# Altium integrated library EFR_Lib.IntLib: 430 symbols (part 5 of 6)
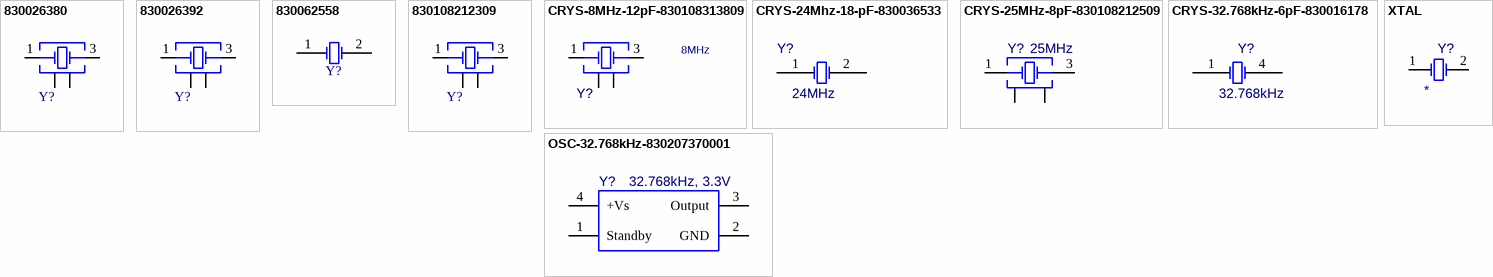
[diagram p33: symbols 830026380 to XTAL]

## 830062558
designator Y?, comment 32.768kHz  (value not drawn)
WE-XTAL Watch Crystal, SMT, IQXC-25, 32.768kHz, +/-10ppm; Manufacturer P/N: 830062558; Manufacturer: Wurth Elektronik; Load Capacitance: 9pF; ComponentLink1Description: Website Link; ComponentLink1URL: https://www.we-online.com/redexpert/article/830062558?ad; ComponentLink2Description: Datasheet Link; ComponentLink2URL: https://www.we-online.com/redexpert/spec/830062558?ad; Category: Crystals; Match Code: WE-XTAL; Mount: Surface Mount; Operating Temperature Max: 85°C; Operating Temperature Min: -40°C; Packaging: Tape and Reel; Case/Size Code: IQXC-25; Length: 2mm; Width: 1.2mm; Height: 0.6mm; Frequency: 32.768kHz; Frequency Tolerance: +/-10ppm
footprint WE-XTAL_IQXC-25
pins: 1 OSC1, 2 OSC2

## 830108212309
designator Y?, comment 24MHz  (value not drawn)
WE-XTAL Quartz Crystal, SMT, IQXC-42, 24MHz, +/-10ppm; Manufacturer P/N: 830108212309; Manufacturer: Wurth Elektronik; Frequency Stability: +/-15ppm; Load Capacitance: 8pF; ComponentLink1Description: Website Link; ComponentLink1URL: https://www.we-online.com/redexpert/article/830108212309?ad; ComponentLink2Description: Datasheet Link; ComponentLink2URL: https://www.we-online.com/redexpert/spec/830108212309?ad; Category: Crystals; Match Code: WE-XTAL; Mount: Surface Mount; Operating Temperature Max: 85°C; Operating Temperature Min: -40°C; Packaging: Tape and Reel; Case/Size Code: IQXC-42; Length: 2mm; Width: 1.6mm; Height: 0.5mm; Frequency: 24MHz; Frequency Tolerance: +/-10ppm
footprint WE-XTAL_IQXC-42 new (Quartz Crystal, size IQXC-42, body 2x1.6mm)
pins: 1 Crystal, 2 GND, 3 Crystal, 4 GND

## CRYS-8MHz-12pF-830108313809
designator Y?, comment 8MHz
WE-XTAL Quartz Crystal, SMT, CFPX-180, 8MHz, +/-30ppm; Manufacturer P/N: 830108313809; Manufacturer: Wurth Elektronik; Frequency Stability: +/-50ppm; Load Capacitance: 12pF; ComponentLink1Description: Website Link; ComponentLink1URL: https://www.we-online.com/redexpert/article/830108313809?ad; ComponentLink2Description: Datasheet Link; ComponentLink2URL: https://www.we-online.com/redexpert/spec/830108313809?ad; Category: Crystals; Match Code: WE-XTAL; Mounting Technology: SMT; Operating Temperature Max: 85°C; Operating Temperature Min: -40°C; Packaging: Tape and Reel; Case/Size Code: CFPX-180; Length: 3.4mm; Width: 2.7mm; Height: 0.8mm; Frequency: 8MHz; Frequency Tolerance: +/-30ppm
footprint WE-XTAL_CFPX-180
pins: 1 Crystal, 2 GND&Lid, 3 Crystal, 4 GND&Lid

## CRYS-24Mhz-18-pF-830036533
designator Y?, comment 24MHz
WE-XTAL Quartz Crystal, SMT, HC49/4HSMX, 24MHz, +/-30ppm; PartNumber: 830036533; Manufacturer: Wurth Elektronik; Frequency Stability: +/-50ppm; Load Capacitance: 18pF; ComponentLink1Description: Manufacturer; ComponentLink1URL: https://www.we-online.com/katalog/en/WE-XTAL#830036533; ComponentLink2Description: Datasheet; ComponentLink2URL: https://katalog.we-online.com/pbs/datasheet/830036533.pdf; Operating Temperature: -40 to +85degC; Packaging: Tape and Reel; Published Date: July 2020; Size: HC49/4HSMX; Frequency: 24MHz; Frequency Tolerance: +/-30ppm; Mounting Technology: SMT; Supplier 1: Mouser; Supplier 2: DigiKey; Supplier 3: Mouser; Supplier 4: DigiKey; Supplier Part Number 1: 710-830036533; Supplier Part Number 2: 1923-830036533CT-ND; Supplier Part Number 3: 710-830036533; Supplier Part Number 4: 1923-830036533CT-ND
footprint WE-XTAL_HC49/4HSMX
pins: 1 OSC1, 2 OSC2

## CRYS-25MHz-8pF-830108212509
designator Y?, comment 25MHz
WE-XTAL Quartz Crystal, SMT, IQXC-42, 25MHz, +/-10ppm; PartNumber: 830108212509; Manufacturer: Wurth Elektronik; Frequency Stability: +/-15ppm; Load Capacitance: 8pF; ComponentLink1Description: Manufacturer; ComponentLink1URL: https://www.we-online.com/catalog/en/WE-XTAL?sq=830108212509#/articles/IQXC-42; ComponentLink2Description: Datasheet; ComponentLink2URL: https://katalog.we-online.com/pbs/datasheet/830108212509.pdf; Operating Temperature: -40 to +85degC; Packaging: Tape and Reel; Published Date: July 2020; Size: IQXC-42; Frequency: 25MHz; Frequency Tolerance: +/-10ppm; Mounting Technology: SMT
footprint WE-XTAL_IQXC-42
pins: 1 Crystal, 2 GND, 3 Crystal, 4 GND

## CRYS-32.768kHz-6pF-830016178
designator Y?, comment 32.768kHz
WE-XTAL Watch Crystal, SMT, 85SMX, 32.768kHz, +/-20ppm; PartNumber: 830016178; Manufacturer: Wurth Elektronik; Load Capacitance: 6pF; ComponentLink1Description: Manufacturer; ComponentLink1URL: https://www.we-online.com/katalog/en/WE-XTAL_WATCHCRYSTAL#830016178; ComponentLink2Description: Datasheet; ComponentLink2URL: https://katalog.we-online.com/pbs/datasheet/830016178.pdf; Operating Temperature: -40 to +85degC; Packaging: Tape and Reel; Published Date: July 2020; Size: 85SMX; Frequency Stability: -; Frequency: 32.768kHz; Frequency Tolerance: +/-20ppm; Mounting Technology: SMT
footprint WE-XTAL_85SMX
pins: 1 Crystal, 4 Crystal

## OSC-32.768kHz-830207370001
designator Y?, comment 32.768kHz, 3.3V
WE-SPXO Simple Packaged Quartz Oscillator, SMT, IQXO-402, 32.768kHz, 3.3V; Manufacturer: Wurth Elektronik; PartNumber: 830207370001; Frequency Stability: +/-30ppm; ComponentLink1URL: https://www.we-online.com/catalog/en/WE-SPXO?sq=830207370001#/articles/WE-SPXO_IQXO-402; ComponentLink2URL: https://www.we-online.com/catalog/datasheet/830207370001.pdf; Supply Voltage: 3.3V; Size: IQXO-402; Packaging: Tape and Reel; Operating Temperature: -40 to +85degC; Mounting Technology: SMT; Published Date: November 2020; ComponentLink1Description: Manufacturer; Frequency: 32.768kHz; ComponentLink2Description: Datasheet
footprint WE-SPXO_IQXO-402
pins: 1 Standby, 2 GND, 3 Output, 4 +Vs

## XTAL
designator Y?
Crystal Oscillator; PartNumber: *; LoadCap: *; Manufacturer: *; Frequence: *
simulation model XTAL (Spice Subcircuit)
footprint XT49S (Vishay Crystal)
footprint WE-XTAL_HC49/4HSMX (Quartz Crystal, size HC49/4HSMX, body 11.4x4.9mm)
pins: 1 OSC1, 2 OSC2


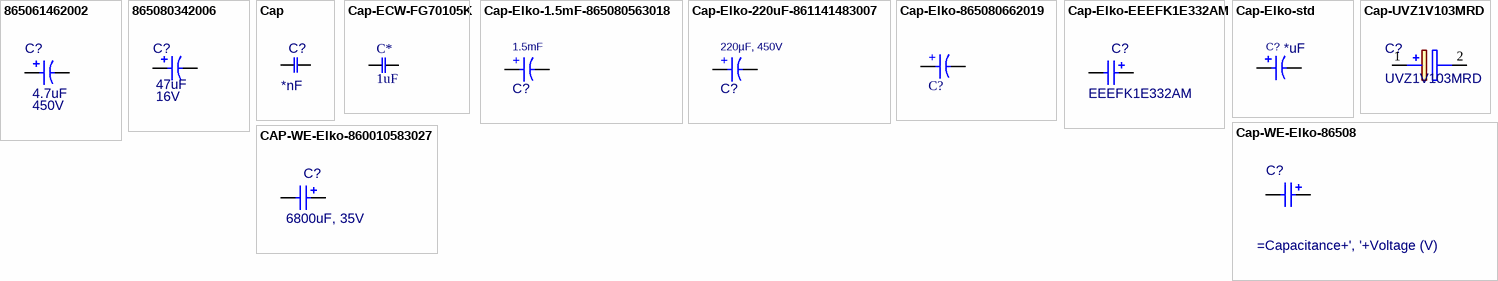
[diagram p20: symbols 865061462002 to CAP-WE-Elko-860010583027]

## 865061462002
designator C?, comment 4.7uF  Rated Voltage (DC): 450V
WCAP-ASLL Aluminum Electrolytic Capacitor, V-Chip, SMT, D12.5 x H14mm, 4.7uF, 450V; Manufacturer Part Number: 865061462002; Manufacturer: Wurth Elektronik; Capacitance Tolerance: +/-20%; Dissipation Factor: 20%; Endurance: 5000h; Leakage Current: 121.15uA; Ripple Current: 50mA; Technical Reference: ASDH1404R7M450DVCTGE000; Category: Aluminum Electrolytic Capacitors; Match Code: WCAP-ASLL; ComponentLink1Description: Website Link; ComponentLink1URL: https://www.we-online.com/redexpert/article/865061462002?ad; ComponentLink2Description: Datasheet Link; ComponentLink2URL: https://www.we-online.com/redexpert/spec/865061462002?ad; Mount: Surface Mount; Operating Temperature Max: 105°C; Operating Temperature Min: -40°C; Packaging: Tape and Reel; Height: 14mm; Diameter: 12.5mm; Capacitance: 4.7uF
simulation model 865061462002_4.7uF
footprint WCAP-ASLL_D12.5H14 (Aluminium Electrolytic V-Chip SMT Capacitors, 12.5x14mm)
pins: 1 P, 2 N
text: +

## 865080342006
designator C?, comment 47uF  Rated Voltage (DC): 16V
WCAP-ASLI Aluminum Electrolytic Capacitor, V-Chip, D5 x H5.5mm, 47uF, 16V; Manufacturer Part Number: 865080342006; Manufacturer: Wurth Elektronik; Capacitance Tolerance: +/-20%; Dissipation Factor: 16%; Endurance: 2000h; Leakage Current: 7.52uA; Ripple Current: 195mA; Technical Reference: ASEC055470M016DVCTBB000; Category: Aluminum Electrolytic Capacitors; Match Code: WCAP-ASLI; ComponentLink1Description: Website Link; ComponentLink1URL: https://www.we-online.com/redexpert/article/865080342006?ad; ComponentLink2Description: Datasheet Link; ComponentLink2URL: https://www.we-online.com/redexpert/spec/865080342006?ad; Mount: Surface Mount; Operating Temperature Max: 105°C; Operating Temperature Min: -55°C; Packaging: Tape and Reel; Height: 5.5mm; Diameter: 5mm; Capacitance: 47uF
simulation model 865080342006_47uF
footprint WCAP-ASLI_D5H5.5 (Aluminium Electrolytic V-Chip SMT Capacitors, 5x5.5mm)
pins: 1 P, 2 N
text: +

## Cap
designator C?, comment Capacitance: *nF  (hidden comment: Capacitor)
General Capacitor; Type: Ceramic; PinNumber: 2; Value: *nF; Manufacturer: *; PartNumber: *; Voltage (V): *; Current (A): *; Tolerance: *; Power (W): *; Resistance: *
footprint 0603(1608)_L (Chip Resistor, 2-Leads, Body 1.60x0.85mm, IPC High Density)
footprint 0603(1608)_N (Chip Resistor, 2-Leads, Body 1.60x0.85mm, IPC Medium Density)
footprint 0603(1608)_M (Chip Resistor, 2-Leads, Body 1.60x0.85mm, IPC Low Density)
footprint 0805(2012)_L (Chip Resistor, 2-Leads, Body 2.00x1.25mm, IPC High Density)
footprint 0805(2012)_N (Chip Resistor, 2-Leads, Body 2.00x1.25mm, IPC Medium Density)
footprint 0805(2012)_M (Chip Resistor, 2-Leads, Body 2.00x1.25mm, IPC Low Density)
footprint 1206(3216)_L (Chip Resistor, Body 3.2x1.6mm, IPC High Density)
footprint 1206(3216)_N (Chip Resistor, Body 3.2x1.6mm, IPC Medium Density)
footprint 1206(3216)_M (Chip Resistor, Body 3.2x1.6mm, IPC Low Density)
footprint Y-Cap
footprint 1812
pins: 1, 2

## Cap-ECW-FG70105K
designator C*, comment 1uF
Film Capacitors 700VDC 1uF 10% ST Lead AEC-Q200; Manufacturer P/N: ECW-FG70105K; Manufacturer: Panasonic; Rated Voltage (DC): 700V (DC); ComponentLink1Description: Datasheet; ComponentLink1URL: https://www.mouser.com/catalog/specsheets/Panasonic_Capacitor%20Film%20Leaded%20(ECW-FG%20Series)%20040120.pdf; Category: Film Capacitor; Capacitance: 1uF; Tolerance: 10%
footprint ECWFG70105K
pins: 1, 2

## Cap-Elko-1.5mF-865080563018
designator C?, comment 1.5mF
WCAP-ASLI Aluminum Electrolytic Capacitor, V-Chip, D16 x H17mm, 1.5mF, 35V; Manufacturer P/N: 865080563018; Manufacturer: Wurth Elektronik; Capacitance Tolerance: +/-20%; Dissipation Factor: 14%; Endurance: 5000h; Leakage Current: 525uA; Ripple Current: 1250mA; Technical Reference: ASEK170152M035DVCTHE000; Category: Aluminum Electrolytic Capacitors; Match Code: WCAP-ASLI; ComponentLink1Description: Website Link; ComponentLink1URL: https://www.we-online.com/redexpert/article/865080563018?ad; ComponentLink2Description: Datasheet Link; ComponentLink2URL: https://www.we-online.com/redexpert/spec/865080563018?ad; Mounting Technology: Surface Mount; Operating Temperature Max: 105°C; Operating Temperature Min: -55°C; Packaging: Tape and Reel; Height: 17mm; Diameter: 16mm; Capacitance: 1.5mF; Rated Voltage (DC): 35V; Supplier 1: Mouser; Supplier Part Number 1: 710-865060562009
footprint WCAP-ASLI_D16H17
simulation model 865080563018_1.5mF
pins: 1 P, 2 N
text: +

## Cap-Elko-220uF-861141483007
designator C?, comment 220µF, 450V
WCAP-AI3H Aluminum Electrolytic Capacitor, Snap-In, D22 x H50mm, 220µF, 450V; Manufacturer P/N: 861141483007; Manufacturer: Wurth Elektronik; Capacitance Tolerance: +/-20%; Dissipation Factor: 20%; Endurance: 3000h; Leakage Current: 943.93µA; Ripple Current: 1000mA; Technical Reference: ANJN500221M450DSIC3C000; Category: Aluminum Electrolytic Capacitors; Match Code: WCAP-AI3H; ComponentLink1Description: Website Link; ComponentLink1URL: https://www.we-online.com/redexpert/article/861141483007?ad; ComponentLink2Description: Datasheet Link; ComponentLink2URL: https://www.we-online.com/redexpert/spec/861141483007?ad; Mounting Technology: THT; Operating Temperature Max: 105°C; Operating Temperature Min: -25°C; Packaging: Tray; Height: 50mm; Diameter: 22mm; Capacitance: 220µF; Rated Voltage (DC): 450V; Supplier 1: Mouser; Supplier Part Number 1: 710-861141483007
footprint WCAP-AI3H_D22H50 (Aluminium Electrolytic Snap-In Capacitors, 22x50mm)
simulation model 861141483007_0.22mF
pins: 1 P, 2 N
text: +

## Cap-Elko-865080662019
designator C?, comment 330uF  (value not drawn)
WCAP-ASLI Aluminum Electrolytic Capacitor, V-Chip, D12.5 x H14mm, 330uF, 50V; Manufacturer Part Number: 865080662019; Manufacturer: Wurth Elektronik; Capacitance Tolerance: +/-20%; Dissipation Factor: 12%; Endurance: 5000h; Leakage Current: 165uA; Ripple Current: 800mA; Technical Reference: ASEH140331M050DVCTGE000; Category: Aluminum Electrolytic Capacitors; Match Code: WCAP-ASLI; ComponentLink1Description: Website Link; ComponentLink1URL: https://www.we-online.com/redexpert/article/865080662019?ad; ComponentLink2Description: Datasheet Link; ComponentLink2URL: https://www.we-online.com/redexpert/spec/865080662019?ad; Mount: Surface Mount; Operating Temperature Max: 105°C; Operating Temperature Min: -55°C; Packaging: Tape and Reel; Height: 14mm; Diameter: 12.5mm; Capacitance: 330uF; Rated Voltage (DC): 50V
simulation model 865080662019_330uF
footprint WCAP-ASLI_D12.5H14 (Aluminium Electrolytic V-Chip SMT Capacitors, 12.5x14mm)
pins: 1 P, 2 N
text: +

## Cap-Elko-EEEFK1E332AM
designator C?, comment EEEFK1E332AM
Aluminum Electrolytic Capacitors (Surface Mount Type), 3300uF, +/-20%, 25VDC; Manufacturer: Panasinic Industry; Endurance: 5000h; Leakage Current: 825µA; Ripple Current max.: 75mA; PinNumber: 2; ComponentLink1Description: Manufacturer; ComponentLink1URL: https://industrial.panasonic.com/ww/products/capacitors/aluminum-capacitors/aluminum-cap-smd/models/EEEFK1E332AM; ComponentLink2Description: Datasheet; ComponentLink2URL: https://industrial.panasonic.com/cdbs/www-data/pdf/RDE0000/ABA0000C1178.pdf; Length: 16.5mm; Mounting Technology: SMT; Operating Temperature: -55 to +105degC; Packaging: Tape and Reel; Diameter: 18mm; PartNumber: EEEFK1E332AM; Capacitance Tolerance: +/-20%; Tolerance: +/-20%; Resistance: *; Current (A): 75mA; Voltage (V): 25VDC; Power (W): *; Rated Voltage: 25VDC; Capacitance: 3300uF
footprint CAP_AE_SMT (Electrolytic V-Chip SMT Capacitors, 19x19mm; EEEFK1E332AM)
pins: 1 N, 2 P

## Cap-Elko-std
designator C?, comment *uF
Capacitance: *; Capacitance (F): *; Deilectric: *; Dielectric Class: *; Height (mm): *; Length (mm): *; Manufacturer P/N: *; Mounting Technology: *; OP. Temperature Max (°C): *; OP. Temperature Min (°C): *; Package: *; Pin Number: *; Rated Voltage (U=[V]): *; Tolerance (%): *; Type1: *; Type2: *; Type3: *; Voltage (V): *; Width (mm): *; ComponentLink1Description: Datasheet; ComponentLink1URL: *
footprint CAPMP7.6X4.3_3.1N_KEM
footprint WCAP-ASLI_D5H5.5 (Aluminium Electrolytic V-Chip SMT Capacitors, 5x5.5mm)
footprint WCAP-ASLI_D12.5H14 (Aluminium Electrolytic V-Chip SMT Capacitors, 12.5x14mm)
footprint MAL215299702E3; pin to pad 1>2 2>1
footprint WCAP-ATG5_D16H31.5 (Aluminum Electrolytic Capacitors, 16x31.5mm)
footprint WCAP-ASLI_D16H17 (Aluminium Electrolytic V-Chip SMT Capacitors, 16x17mm)
footprint CAPAE1900X2200N
footprint WCAP-AIE8_D25H25 (Aluminium Electrolytic Snap-In Capacitors, 25x25mm)
pins: 1 P, 2 N
text: +

## Cap-UVZ1V103MRD
designator C?, comment UVZ1V103MRD
Nichicon 10000uF 35V dc Aluminium Electrolytic Capacitor; Datasheet Link: https://componentsearchengine.com/Datasheets/1/UVZ1V103MRD.pdf; Height: 52mm; Manufacturer: Nichicon; PartNumber: UVZ1V103MRD; ComponentLink1Description: Datasheet; ComponentLink1URL: https://products.nichicon.co.jp/en/pdf/XJA043/e-uvz.pdf
footprint Nichicon-CAP-Elko-Radial-D22L50
pins: 1 +, 2 -

## Cap-WE-Elko-86508
designator C?  (value not drawn)
WCAP-ASLI SMT Aluminum Electrolytic Capacitors, D*mm x L*mm, *uF, +/-*%, *VDC; PartNumber: 86508*; Manufacturer: Wurth Elektronik; Dissipation Factor: 24%; Endurance: 2000h; Leakage Current: 3uA; Ripple Current max.: 75mA; Capacitance Tolerance: +/-20%; Technical Reference: ASEB055220M6R3DVCTAB000; PinNumber: 2; ComponentLink1Description: Manufacturer; ComponentLink1URL: http://www.we-online.de; ComponentLink2Description: Datasheet; ComponentLink2URL: https://katalog.we-online.com/pbs/datasheet/865080140001.pdf; Length: *mm; Mounting Technology: SMT; Operating Temperature: -55 to +105degC; Packaging: Tape and Reel; Published Date: August 2019; Diameter: *mm; Tolerance: +/-20%; Resistance: *; Current (A): 75mA; Voltage (V): *VDC; Power (W): *; Rated Voltage: *VDC; Capacitance: *uF; Value: =Capacitance+', '+Voltage (V)
footprint CAP-WE-WCAP-ASLI_10x10.5 (Aluminium Electrolytic V-Chip SMT Capacitors, 10x10.5mm)
footprint CAP-WE-WCAP-ASLI_16x17 (Aluminium Electrolytic V-Chip SMT Capacitors, 16x17mm)
footprint CAP-WE-WCAP-ASLI_4x5.5 (Aluminium Electrolytic V-Chip SMT Capacitors, 4x5.5mm)
footprint CAP-WE-WCAP-ASLI_5x5.5 (Aluminium Electrolytic V-Chip SMT Capacitors, 5x5.5mm)
footprint CAP-WE-WCAP-ASLI_6.3x5.5 (Aluminium Electrolytic V-Chip SMT Capacitors, 6.3x5.5mm)
footprint CAP-WE-WCAP-ASLI_6.3x5.5 (Aluminium Electrolytic V-Chip SMT Capacitors, 6.3x5.5mm)
footprint CAP-WE-WCAP-ASLI_6.3x7.7 (Aluminium Electrolytic V-Chip SMT Capacitors, 6.3x7.7mm)
footprint CAP-WE-WCAP-ASLI_8x10.5 (Aluminium Electrolytic V-Chip SMT Capacitors, 8x10.5mm)
footprint CAP-WE-WCAP-ASLI_8x6.5 (Aluminium Electrolytic V-Chip SMT Capacitors, 8x6.5mm)
footprint CAP-WE-WCAP-ASLI_12.5x14 (Aluminium Electrolytic V-Chip SMT Capacitors, 12.5x14mm)
footprint WCAP-ASLI_D16H17 (Aluminium Electrolytic V-Chip SMT Capacitors, 16x17mm)
pins: 1 N, 2 P

## CAP-WE-Elko-860010583027
designator C?, comment 6800uF, 35V
WCAP-ATG8 Aluminum Electrolytic Capacitor, Radial, THT, D22xH41mm, 6800uF, 35V; PartNumber: 860010583027; Manufacturer: Wurth Elektronik; Dissipation Factor: 12%; Endurance: 2000h; Leakage Current: 2380uA; Ripple Current: 3630mA; Capacitance Tolerance: +/-20%; Rated Voltage: 35VDC; Technical Reference: ATBN410682M035DSPS2B000; ComponentLink1Description: Manufacturer; ComponentLink1URL: http://www.we-online.de; ComponentLink2Description: Datasheet; ComponentLink2URL: https://www.we-online.com/catalog/datasheet/860010583027.pdf; Height: 41mm; Mounting Technology: THT; Operating Temperature: -40 to +85degC; Packaging: Ammo Pack; Published Date: May 2020; Capacitance: 6800uF; Diameter: 22mm
footprint CAP-WE-WCAP-ATG8_22x41 (Aluminum Electrolytic Capacitors, 22x41mm)
footprint WCAP-AI3H_D22H50 (Aluminium Electrolytic Snap-In Capacitors, 22x50mm)
pins: 1 N, 2 P


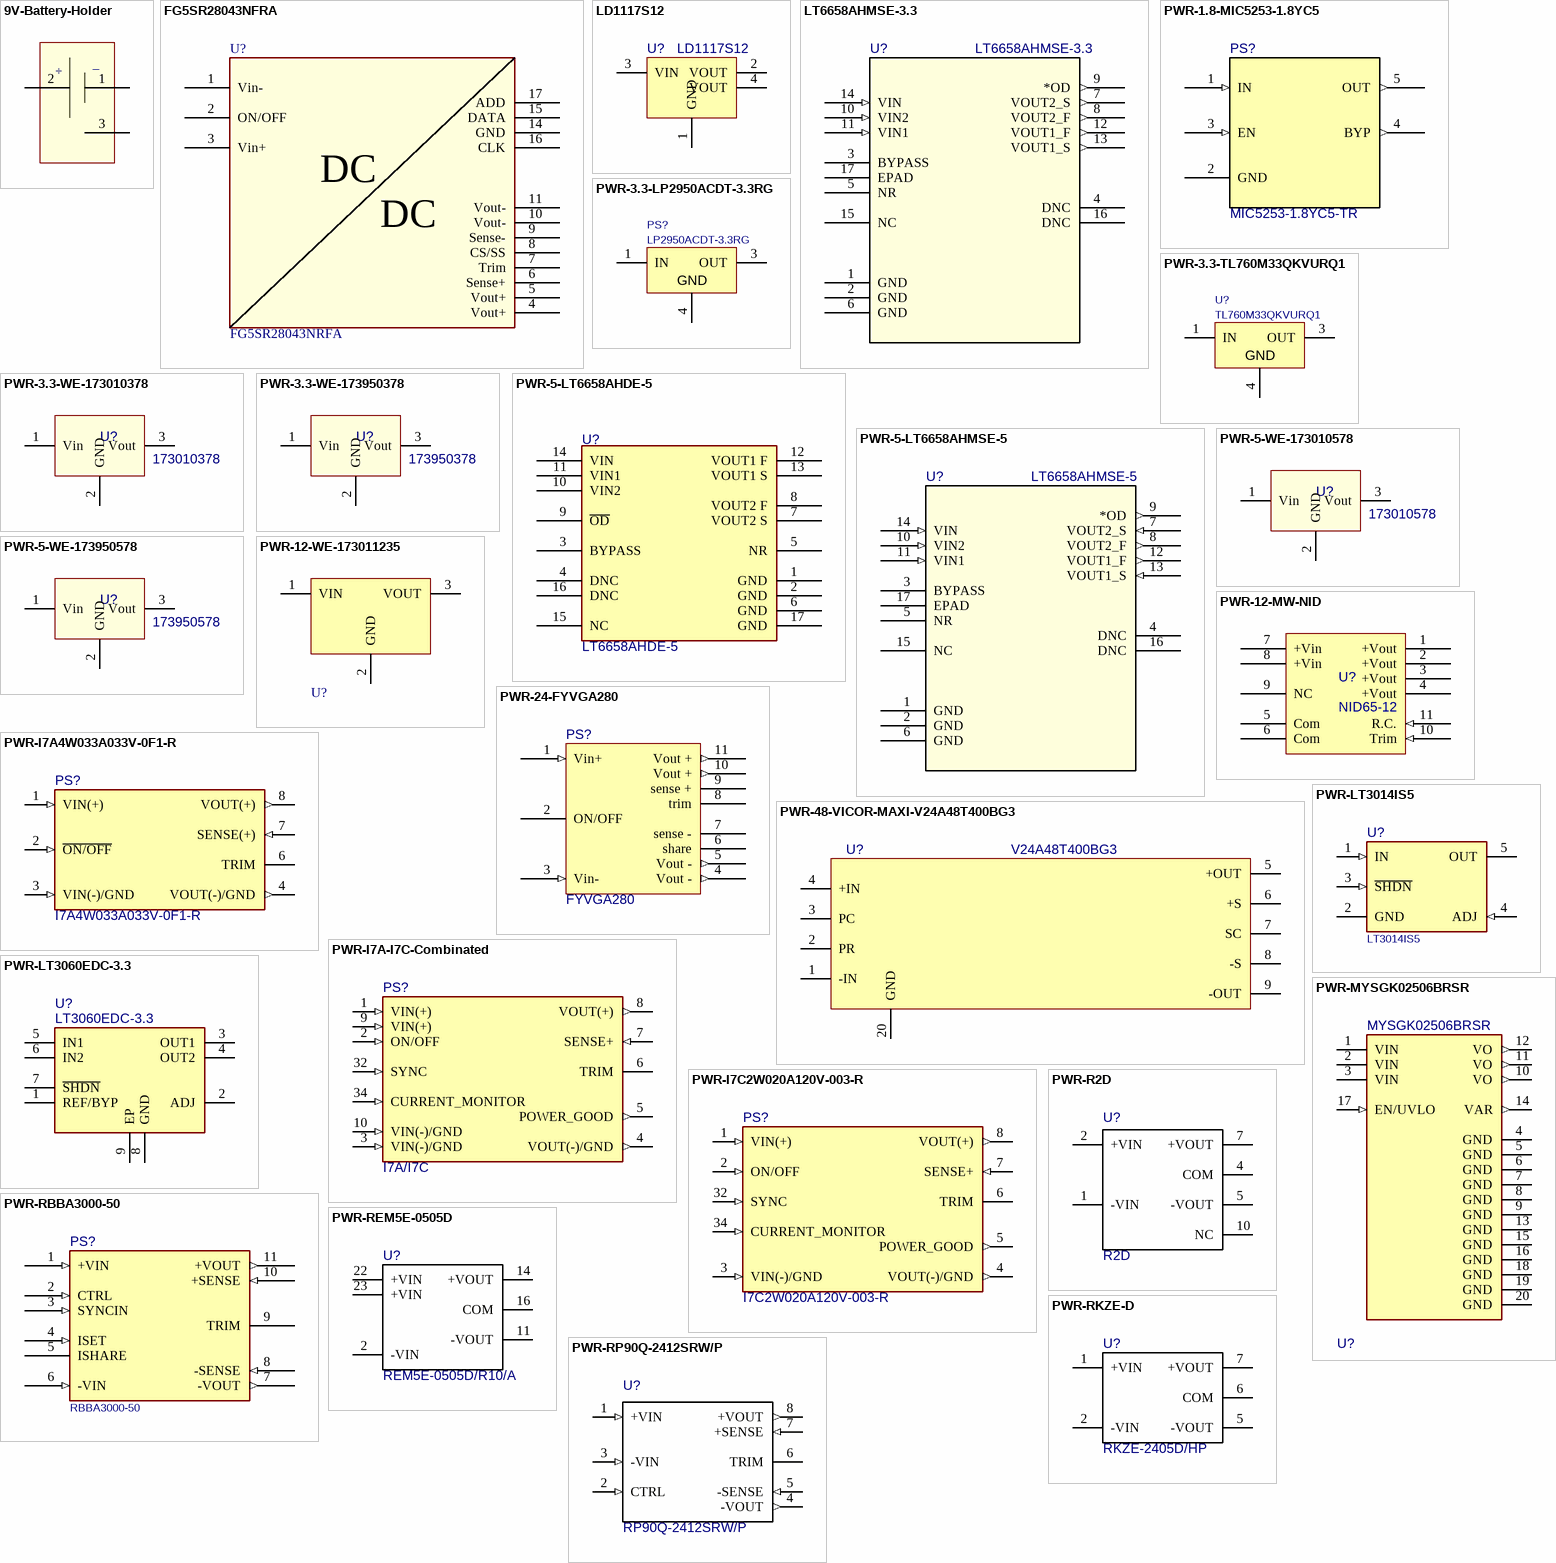
[diagram p21: symbols 9V-Battery-Holder to PWR-RP90Q-2412SRW/P]

## 9V-Battery-Holder
designator ?
footprint 12BH611-GR (9V Battery Holder)
pins: 1, 2, 3
text: _; +

## FG5SR28043NFRA
designator U?, comment PartNumber: FG5SR28043NRFA  (hidden comment: DCDC)  (no BOM)
DC/DC Full Brick Power Converter; Manufactuer: Delta Electronics
pins: 1 Vin- (power), 2 ON/OFF, 3 Vin+ (power), 4 Vout+ (power), 5 Vout+ (power), 6 Sense+, 7 Trim, 8 CS/SS, 9 Sense-, 10 Vout- (power), 11 Vout- (power), 14 GND, 15 DATA, 16 CLK, 17 ADD
text: DC

## LD1117S12
designator U?
Fixed Low Drop Positive Voltage Regulator, 1.2V, 4-Pin SOT-223, Tape and Reel; Manufacturer: STMicroelectronics; PackageDescription: 4-Pin SOT-223 Package, 6.5 x 3.5 mm Body, 2.3 mm Pitch, 7 mm Lead Span; ComponentLink2Description: Datasheet; PackageReference: SOT-223; ComponentLink2URL: http://www.st.com/internet/com/TECHNICAL_RESOURCES/TECHNICAL_LITERATURE/DATASHEET/CD00000544.pdf; ComponentLink1Description: Manufacturer URL; ComponentLink1URL: http://www.st.com; PartNumber: LD1117S12
footprint SOT223_N (SOT223, 4-Leads, Body 6.5x3.5mm, Pitch 2.3mm, Lead Span 7mm, IPC Medium Density)
footprint SOT223_M (SOT223, 4-Leads, Body 6.5x3.5mm, Pitch 2.3mm, Lead Span 7mm, IPC Low Density)
footprint SOT223_L (SOT223, 4-Leads, Body 6.5x3.5mm, Pitch 2.3mm, Lead Span 7mm, IPC High Density)
pins: 1 GND (power), 2 VOUT (power), 3 VIN (power), 4 VOUT (power)

## LT6658AHMSE-3.3
designator U?
Precision Dual Output, High Current, Low Noise, Voltage Reference 3V; Manufacturer: Analog Devices Inc; Copyright: Copyright (C) 2016 Accelerated Designs. All rights reserved; PartNumber: LT6658AHMSE-3.3; Type: DEV; ComponentLink1Description: Manufacturer; ComponentLink1URL: https://www.analog.com/en/products/lt6658.html; ComponentLink2Description: Datasheet; ComponentLink2URL: https://www.analog.com/media/en/technical-documentation/data-sheets/LT6658.pdf
footprint MSE_16_ADI
footprint DFN16_EP_L (AD)
footprint DFN16_EP_M (AD)
footprint DFN16_EP_N (AD)
pins: 1 GND (power), 2 GND (power), 3 BYPASS, 4 DNC, 5 NR, 6 GND (power), 7 VOUT2_S (out), 8 VOUT2_F (out), 9 *OD (out), 10 VIN2 (in), 11 VIN1 (in), 12 VOUT1_F (out), 13 VOUT1_S (out), 14 VIN (in), 15 NC, 16 DNC, 17 EPAD

## PWR-1.8-MIC5253-1.8YC5
designator PS?, comment MIC5253-1.8YC5-TR
100mA 1.8V Low Noise uCap Teeny™ LDO; Manufacturer: Microchip; PartNumber: MIC5253-1.8YC5-TR; ComponentLink1Description: Manufacturer; ComponentLink1URL: https://www.microchip.com/en-us/product/MIC5253; ComponentLink2Description: Datasheet; ComponentLink2URL: https://ww1.microchip.com/downloads/en/DeviceDoc/mic5253.pdf
footprint SC70-5_N (DCK5)
pins: 1 IN (in), 2 GND (power), 3 EN (in), 4 BYP (out), 5 OUT (out)

## PWR-3.3-LP2950ACDT-3.3RG
designator PS?, comment LP2950ACDT-3.3RG
Voltage Regulator - Low Power Low, Dropout 100mA 3.3V; Manufacturer: OnSemi; Vout Adj(Max)(V): 1.8; SubFamily: Single Channel LDO; Fixed Output Options(V): 1.8; ComponentLink2Description: Datasheet; PartNumber: LP2950ACDT-3.3RG; ComponentLink2URL: https://www.onsemi.com/pdf/datasheet/lp2950-d.pdf; ComponentLink1URL: https://www.onsemi.com/products/power-management/linear-regulators-ldo/lp2950; Mounting Technology: Surface Mount; Code_JEDEC: TO-252; ComponentLink1Description: Manufacturer; PackageDescription: 3-Pin Plastic Flange Mount, Body 6.1 x 6.6 mm, Pitch 2.29 mm
footprint TO-252_M (KVU) (DPAK, 3-Leads, Body 6.7x6.22mm, Pitch 2.29mm, IPC Low Density)
footprint TO-252_N (KVU) (DPAK, 3-Leads, Body 6.7x6.22mm, Pitch 2.29mm, IPC Medium Density)
footprint TO-252_L (KVU) (DPAK, 3-Leads, Body 6.7x6.22mm, Pitch 2.29mm, IPC High Density)
pins: 1 IN (power) "Input voltage. Connect to ground as close to device as possible, through a ceramic capacitor.", 3 OUT (power) "Output. Connect to ground with >=22-uF capacitor, ESR < 5 Ohm at 10 kHz.", 4 GND (power) "Ground. Internally connected to heatsink"

## PWR-3.3-TL760M33QKVURQ1
designator U?, comment TL760M33QKVURQ1
Single Output Automotive LDO, 500 mA, Fixed 3.3 V Output, 3.8 to 26 V Input, 3-pin PFM (KVU), -40 to 125 degC, Green (RoHS & no Sb/Br); Manufacturer: Texas Instruments; Vout Adj(Max)(V): 3.3; Iout(Max)(A): 0.5; Vin(Min)(V): 3.8; Vin(Max)(V): 26; Vdo(Typ)(mV): 500; Accuracy(%): 3; SubFamily: Single Channel LDO; Iq(Typ)(mA): 20; Fixed Output Options(V): 3.3; ComponentLink3URL: http://www.ti.com/litv/pdf/mpsf018c; ComponentLink2Description: Datasheet; PartNumber: TL760M33QKVURQ1; Rating: Automotive; ComponentLink2URL: http://www.ti.com/general/docs/lit/getliterature.tsp?genericPartNumber=TL760M33-Q1&fileType=pdf; Eco-Plan: Green (RoHS & no Sb/Br); ComponentLink1URL: http://www.ti.com/; Mounting Technology: Surface Mount; ComponentLink4URL: Samples URL:http://www.ti.com/product/tl760m33-q1#samples; Code_JEDEC: TO-252; ComponentLink3Description: Package Specification; PackageReference: KVU0003A; Vout Adj(Min)(V): 3.3; ComponentLink1Description: Manufacturer URL; ComponentLink4Description: URL Link1; DatasheetVersion: SGLS284I; PackageDescription: 3-Pin Plastic Flange Mount, Body 6.1 x 6.6 mm, Pitch 2.29 mm; PackageVersion: 4205521-2/D
footprint TO-252_M (KVU) (DPAK, 3-Leads, Body 6.7x6.22mm, Pitch 2.29mm, IPC Low Density)
footprint TO-252_N (KVU) (DPAK, 3-Leads, Body 6.7x6.22mm, Pitch 2.29mm, IPC Medium Density)
footprint TO-252_L (KVU) (DPAK, 3-Leads, Body 6.7x6.22mm, Pitch 2.29mm, IPC High Density)
pins: 1 IN (power) "Input voltage. Connect to ground as close to device as possible, through a ceramic capacitor.", 3 OUT (power) "Output. Connect to ground with >=22-uF capacitor, ESR < 5 Ohm at 10 kHz.", 4 GND (power) "Ground. Internally connected to heatsink"

## PWR-3.3-WE-173010378
designator U?, comment 173010378
MagI³C-FDSM Fixed Step Down Regulator Module; Manufacturer: Wurth Elektronik; InputVoltage: 7-28V; OutputCurrent: 1A; OutputVoltage: 3.3V; PinNumber: 3; PublishedDate: Aug 2016; ComponentLink1Description: Datasheet (Online); ComponentLink1URL: https://katalog.we-online.de/pm/datasheet/173010378.pdf; ComponentLink2Description: Datasheet (Local); ComponentLink2URL: ..\Datasheet\Wuerth_Elektronik\173010378.pdf; PartNumber: 173010378; Package: SIP-3; ComponentLink3Description: Datasheet (SVN); ComponentLink3URL: https://teamsvn.elbflorace.de/00_Bibliothek/Libraries/Altium/AltiumLibs/Datasheet/Wuerth_Elektronik/173010378.pdf; ComponentLink4Description: Manufacturer-Site; ComponentLink4URL: https://katalog.we-online.de/de/pm/MAGIC_FDSM_FIXED_OUTPUT_VOLTAGE/S/17301037
footprint WE-FDSM_173010x78 (SIP-3, Body 11.6x8.5x10.5)
pins: 1 Vin (power), 2 GND (power), 3 Vout (power)

## PWR-3.3-WE-173950378
designator U?, comment 173950378
MagI³C-FDSM Fixed Step Down Regulator Module; Manufacturer: Wurth Elektronik; InputVoltage: 6-28V; OutputCurrent: 0.5A; OutputVoltage: 3.3; PinNumber: 3; PublishedDate: Aug 2016; ComponentLink1Description: Datasheet (Online); ComponentLink1URL: https://katalog.we-online.de/pm/datasheet/173950378.pdf; ComponentLink2Description: Datasheet (Local); ComponentLink2URL: ..\Datasheet\Wuerth_Elektronik\173950378.pdf; PartNumber: 173950378; Package: SIP-3; ComponentLink3Description: Datasheet (SVN); ComponentLink3URL: https://teamsvn.elbflorace.de/00_Bibliothek/Libraries/Altium/AltiumLibs/Datasheet/Wuerth_Elektronik/173950378.pdf; ComponentLink4Description: Manufacturer-Site; ComponentLink4URL: https://katalog.we-online.de/de/pm/MAGIC_FDSM_FIXED_OUTPUT_VOLTAGE/S/173950378
footprint WE-FDSM_173010x78 (SIP-3, Body 11.6x8.5x10.5)
pins: 1 Vin (power), 2 GND (power), 3 Vout (power)

## PWR-5-LT6658AHDE-5
designator U?, comment LT6658AHDE-5
Precision Dual Output, High Current, / Low Noise, Voltage Reference; Manufacturer: Linear Technology; PartNumber: LT6658AHDE-5; ComponentLink1Description: Manufacturer; ComponentLink1URL: https://www.analog.com/en/products/lt6658.html; ComponentLink2Description: Datasheet; ComponentLink2URL: https://www.analog.com/media/en/technical-documentation/data-sheets/LT6658.pdf
footprint DFN16_EP_M (AD)
footprint DFN16_EP_N (AD)
footprint DFN16_EP_L (AD)
pins: 1 GND (power), 2 GND (power), 3 BYPASS, 4 DNC, 5 NR, 6 GND (power), 7 VOUT2 S (power), 8 VOUT2 F (power), 9 ~{OD}, 10 VIN2 (power), 11 VIN1 (power), 12 VOUT1 F (power), 13 VOUT1 S (power), 14 VIN (power), 15 NC, 16 DNC, 17 GND (power)

## PWR-5-LT6658AHMSE-5
designator U?, comment LT6658AHMSE-5
Precision Dual Output, High Current, / Low Noise, Voltage Reference; Manufacturer: Analog Devices / Linear Technology; Built_By: EMA_Jessica; Reference Voltage: 5V; Temperature Coefficient: 10ppm/°C; Copyright: Copyright (C) 2016 Accelerated Designs. All rights reserved; RefDes: RefDes; Type: DEV; ComponentLink1Description: Datasheet; ComponentLink1URL: https://www.analog.com/media/en/technical-documentation/data-sheets/LT6658.pdf; ComponentLink2Description: Manufacturer; ComponentLink2URL: https://www.analog.com/en/products/LT6658.html; PartNumber: LT6658AHMSE-5; RoHS: Yes; Category: Voltage References; Case/Package: MSOP; Number of Pins: 16; Min Operating Temperature: -40°C; Max Operating Temperature: 85°C; RoHS Compliant: Yes; REACH SVHC: No SVHC
footprint MSOP_16_L
footprint MSOP_16_N (16-Lead Plastic MSOP)
footprint MSOP_16_M
pins: 1 GND (power), 2 GND (power), 3 BYPASS, 4 DNC, 5 NR, 6 GND (power), 7 VOUT2_S (in), 8 VOUT2_F (out), 9 *OD (out), 10 VIN2 (in), 11 VIN1 (in), 12 VOUT1_F (out), 13 VOUT1_S (in), 14 VIN (in), 15 NC, 16 DNC, 17 EPAD

## PWR-5-WE-173010578
designator U?, comment 173010578
MagI³C-FDSM Fixed Step Down Regulator Module; Manufacturer: Wurth Elektronik; InputVoltage: 8-28V; OutputCurrent: 1A; OutputVoltage: 5V; PinNumber: 3; PublishedDate: Aug 2016; ComponentLink1Description: Datasheet (Online); ComponentLink1URL: https://katalog.we-online.de/pm/datasheet/173010578.pdf; ComponentLink2Description: Datasheet (Local); ComponentLink2URL: ..\Datasheet\Wuerth_Elektronik\173010578.pdf; PartNumber: 173010578; Package: SIP-3; ComponentLink3Description: Datasheet (SVN); ComponentLink3URL: https://teamsvn.elbflorace.de/00_Bibliothek/Libraries/Altium/AltiumLibs/Datasheet/Wuerth_Elektronik/173010578.pdf; ComponentLink4Description: Manufacturer-Site; ComponentLink4URL: https://katalog.we-online.de/de/pm/MAGIC_FDSM_FIXED_OUTPUT_VOLTAGE/S/173010578#vs_ct:1
footprint WE-FDSM_173010x78 (SIP-3, Body 11.6x8.5x10.5)
pins: 1 Vin (power), 2 GND (power), 3 Vout (power)

## PWR-5-WE-173950578
designator U?, comment 173950578
MagI³C-FDSM Fixed Step Down Regulator Module; Manufacturer: Wurth Elektronik; InputVoltage: 7-28V; OutputCurrent: 0.5A; OutputVoltage: 5V; PinNumber: 3; PublishedDate: Aug 2016; ComponentLink1Description: Datasheet (Online); ComponentLink1URL: https://katalog.we-online.de/pm/datasheet/173950578.pdf; ComponentLink2Description: Datasheet (Local); ComponentLink2URL: ..\Datasheet\Wuerth_Elektronik\173950578.pdf; PartNumber: 173950578; ComponentLink3Description: Datasheet (SVN); ComponentLink3URL: https://teamsvn.elbflorace.de/00_Bibliothek/Libraries/Altium/AltiumLibs/Datasheet/Wuerth-Elektronik/173950578.pdf; ComponentLink4Description: Manufacturer-Site; ComponentLink4URL: https://katalog.we-online.de/de/pm/MAGIC_FDSM_FIXED_OUTPUT_VOLTAGE/S/173950578; Package: SIP-3
footprint WE-FDSM_173010x78 (SIP-3, Body 11.6x8.5x10.5)
pins: 1 Vin (power), 2 GND (power), 3 Vout (power)

## PWR-12-MW-NID
designator U?, comment NID65-12
Manufacturer: Mean Well; PinNumber: 11; ComponentLink1Description: Datasheet; ComponentLink1URL: http://www.meanwellusa.com/webapp/product/search.aspx?prod=NID65#1; PartNumber: NID65-12
footprint MW-NID (MeanWell NID Series)
pins: 1 +Vout (power), 2 +Vout (power), 3 +Vout (power), 4 +Vout (power), 5 Com (power), 6 Com (power), 7 +Vin (power), 8 +Vin (power), 9 NC, 10 Trim (in), 11 R.C. (in)

## PWR-12-WE-173011235
designator U?, comment 16-36Vin, 12Vout, 1Aout  (value not drawn)
WPME-FDSM Fixed Step Down Regulator Module, SIP-3, 16-36Vin, 12Vout, 1Aout; Manufacturer: Wurth Elektronik; Manufacturer Part Number: 173011235; Input Voltage Min: 16V; Input Voltage Max: 36V; Output Current: 1A; Output Voltage: 12V; ComponentLink1Description: Manufacturer Link; ComponentLink1URL: https://www.we-online.com/redexpert/article/173011235?ad; ComponentLink2Description: Datasheet; ComponentLink2URL: https://www.we-online.com/redexpert/spec/173011235?ad; Category: Step Down Converter; Match Code: WPME-FDSM; Mount: Through Hole; Operating Temperature Max: 85°C; Operating Temperature Min: -40°C; Packaging: Tube; Case/Size Code: SIP-3; Length: 11.6mm; Width: 8mm; Height: 10.4mm
footprint WPME-FDSM_SIP-3_L11.6W8H10.4
pins: 1 VIN, 2 GND, 3 VOUT

## PWR-24-FYVGA280
designator PS?, comment FYVGA280
800W DC/DC Powermodule
footprint PWR_24_FYVGA280 (800W DCDC)
pins: 1 Vin+ (in), 2 ON/OFF, 3 Vin- (in), 4 Vout - (out), 5 Vout - (out), 6 share, 7 sense -, 8 trim, 9 sense +, 10 Vout + (out), 11 Vout + (out)

## PWR-48-VICOR-MAXI-V24A48T400BG3
designator U?, comment V24A48T400BG3
ComponentLink1Description: Website; ComponentLink1URL: https://www.vicorpower.com/products?productType=cfg&productKey=V24A48T400BG3; ComponentLink2Description: Datasheet; ComponentLink2URL: https://www.vicorpower.com/documents/datasheets/ds_24vin-maxi-family.pdf
footprint Vicor_maxi
pins: 1 -IN, 2 PR, 3 PC, 4 +IN, 5 +OUT, 6 +S, 7 SC, 8 -S, 9 -OUT, 20 GND

## PWR-I7A4W033A033V-0F1-R
designator PS?, comment I7A4W033A033V-0F1-R
Non-Isolated PoL Module DC DC Converter 1 Output 3.3V ~ 24V 33A 18V - 60V Input; Manufacturer: TDK-Lambda Americas Inc; PartNumber: I7A4W033A033V-0F1-R; Purchase-URL: https://pricing.snapeda.com/search/part/I7A4W033A033V-0F1-R/?ref=eda; ComponentLink1Description: Manufacturer; ComponentLink1URL: https://product.tdk.com/en/search/power/switching-power/dc-dc-converter/info?part_no=i7A4W033A033V-0F1-R; ComponentLink2Description: Datasheet; ComponentLink2URL: https://product.tdk.com/system/files/dam/doc/product/power/switching-power/dc-dc-converter/catalog/i7a_e.pdf; ComponentLink3Description: SnapEDA; ComponentLink3URL: https://www.snapeda.com/parts/I7A4W033A033V-0F1-R/TDK-Lambda+Americas+Inc/view-part/?ref=snap
footprint TDK_I7A_Standard
pins: 1 VIN(+) (in), 2 ~{ON/OFF} (in), 3 VIN(-)/GND (in), 4 VOUT(-)/GND (out), 6 TRIM, 7 SENSE(+) (in), 8 VOUT(+) (out)

## PWR-I7A-I7C-Combinated
designator PS?, comment I7A/I7C
Non-Isolated PoL Module DC DC Converter 1 Output 8 ~ 24V - - - 20A 9V - 36V Input; Manufacturer: TDK-Lambda Americas Inc; Package: DIP-8 TDK-Lambda; PartNumber: I7A/I7C; ComponentLink1Description: Manufacturer; ComponentLink1URL: https://product.tdk.com/de/search/power/switching-power/dc-dc-converter/info?part_no=i7C2W020A120V-003-R; ComponentLink2Description: Datasheet I7C; ComponentLink2URL: https://product.tdk.com/system/files/dam/doc/product/power/switching-power/dc-dc-converter/catalog/i7c_e.pdf; ComponentLink3Description: SnapEDA; ComponentLink3URL: https://www.snapeda.com/parts/I7C2W020A120V-003-R/TDK-Lambda+Americas+Inc/view-part/?ref=snap
footprint TDK_I7A-I7C_Full_Features
pins: 1 VIN(+) (in), 2 ON/OFF (in), 3 VIN(-)/GND (in), 4 VOUT(-)/GND (out), 5 POWER_GOOD (out), 6 TRIM, 7 SENSE+ (in), 8 VOUT(+) (out), 9 VIN(+) (in), 10 VIN(-)/GND (in), 32 SYNC (in), 34 CURRENT_MONITOR (in)

## PWR-I7C2W020A120V-003-R
designator PS?, comment I7C2W020A120V-003-R
Non-Isolated PoL Module DC DC Converter 1 Output 8 ~ 24V - - - 20A 9V - 36V Input; Manufacturer: TDK-Lambda Americas Inc; Package: DIP-8 TDK-Lambda; PartNumber: I7C2W020A120V-003-R; ComponentLink1Description: Manufacturer; ComponentLink1URL: https://product.tdk.com/de/search/power/switching-power/dc-dc-converter/info?part_no=i7C2W020A120V-003-R; ComponentLink2Description: Datasheet; ComponentLink2URL: https://product.tdk.com/system/files/dam/doc/product/power/switching-power/dc-dc-converter/catalog/i7c_e.pdf; ComponentLink3Description: SnapEDA; ComponentLink3URL: https://www.snapeda.com/parts/I7C2W020A120V-003-R/TDK-Lambda+Americas+Inc/view-part/?ref=snap
footprint TDK_I7C_Full_Features
pins: 1 VIN(+) (in), 2 ON/OFF (in), 3 VIN(-)/GND (in), 4 VOUT(-)/GND (out), 5 POWER_GOOD (out), 6 TRIM, 7 SENSE+ (in), 8 VOUT(+) (out), 32 SYNC (in), 34 CURRENT_MONITOR (in)

## PWR-LT3014IS5
designator U?, comment LT3014IS5
20mA, IN 3V to 80V, OUT 1.22V to 60V Low Dropout Micropower Linear Regulator; Manufacturer: Analog Devices; Pin Number: 5; Supllier 1: Mouser; Package: ThinSOT; Manufacturer P/N: LT3014IS5; ComponentLink1Description: Website; ComponentLink1URL: https://www.analog.com/en/products/lt3014.html; ComponentLink2Description: Datasheet; ComponentLink2URL: https://www.analog.com/media/en/technical-documentation/data-sheets/3014fd.pdf; ComponentLink3Description: SnapEDA; ComponentLink3URL: https://www.snapeda.com/parts/LT3014IS5%23TRPBF/Analog+Devices/view-part/?ref=snap; Mounting Technology: SMT; Supplier Part Number 1: 584-LT3014IS5#TRPBF; Supllier 2: Mouser; Supplier Part Number 2: 584-LT3014IS5#TRMPBF
footprint TSOT-23_L
footprint TSOT-23_N
footprint TSOT-23_M
footprint TSOT-23_MFG
pins: 1 IN (in), 2 GND (power), 3 ~{SHDN} (in), 4 ADJ (in), 5 OUT (power)

## PWR-LT3060EDC-3.3
designator U?, comment LT3060EDC-3.3
45V VIN, Micropower,  Low Noise, 100mA Low  Dropout, Linear Regulator; Manufacturer: Linear Technology; PartNumber: LT3060EDC-3.3#TRMPBF; Height: 0.8mm; ComponentLink1Description: Datasheet; ComponentLink1URL: https://www.analog.com/media/en/technical-documentation/data-sheets/3060fc.pdf; ComponentLink2Description: Manufacturer; ComponentLink2URL: https://www.analog.com/en/products/lt3060.html; Supplier 1: Mouser; Supplier Part Number 1: 584-3060EDC-3.3TMPF
footprint DFN-9_N (Analog Devices DFN-8)
pins: 1 REF/BYP, 2 ADJ, 3 OUT1, 4 OUT2, 5 IN1, 6 IN2, 7 ~{SHDN}, 8 GND, 9 EP

## PWR-MYSGK02506BRSR
designator U?, comment MYSGK02506BRSR
MonoBlock type POL, High input 6A DC-DC converter series; Manufacturer: Murata Electronics; ComponentLink1Description: Manufacturer; ComponentLink1URL: https://power.murata.com/mysgk02506brsr.html; ComponentLink2Description: Datasheet; ComponentLink2URL: https://power.murata.com/datasheet?/data/power/mysgk02506brsr.pdf; PartNumber: MYSGK02506BRSR
footprint Murata_0_MFG
pins: 1 VIN (power), 2 VIN (power), 3 VIN (power), 4 GND (power), 5 GND (power), 6 GND (power), 7 GND (power), 8 GND (power), 9 GND (power), 10 VO (out), 11 VO (out), 12 VO (out), 13 GND (power), 14 VAR (out), 15 GND (power), 16 GND (power), 17 EN/UVLO (in), 18 GND (power), 19 GND (power), 20 GND (power)

## PWR-R2D
designator U?, comment R2D
DC DC CONVERTER +/-5V 2W; PartNumber: R2D-2405/HP; Manufacturer: Recom Power; Package: SMD-10 Recom Power; Price: None; Availability: Unavailable; SnapEDA_Link: https://www.snapeda.com/parts/R2D-2405/HP/Recom%20Power/view-part/?ref=snap; Value: *
footprint Recom_R2D
pins: 1 -VIN (power), 2 +VIN (power), 4 COM (power), 5 -VOUT (power), 7 +VOUT (power), 10 NC

## PWR-RBBA3000-50
designator PS?, comment RBBA3000-50
Non-Isolated PoL Module DC DC Converter 1 Output 0 ~ 60V 50A 9V - 60V Input; Manufacturer: Recom Power; Manufacturer P/N: RBBA3000-50; Package: Half Brick; Pin Count: 11; ComponentLink1Description: Website; ComponentLink1URL: https://recom-power.com/de/products/switching-regulators/switching-regulators-high-power/rec-p-RBBA3000-50.html; ComponentLink2Description: Datasheet; ComponentLink2URL: https://recom-power.com/de/products/switching-regulators/switching-regulators-high-power/rec-p-RBBA3000-50.html?0-2.-layout-layout-main-layout_body-layout_body-main-dataView-viewContainer-rows-3-item-dataView-tabs-contentContainer-panels-1-panel-dataView-viewContainer-rows-1-item-mediaTable-body-rows-3-cells-1-cell-downloadLink; ComponentLink3Description: SnapEDA; ComponentLink3URL: https://www.snapeda.com/parts/RBBA3000-50/Recom%20Power/view-part/4388246/?ref=snap; Mounting Technology: THT
footprint Half-Brick_Recom
pins: 1 +VIN (in), 2 CTRL (in), 3 SYNCIN (in), 4 ISET (in), 5 ISHARE, 6 -VIN (in), 7 -VOUT (out), 8 -SENSE (in), 9 TRIM, 10 +SENSE (in), 11 +VOUT (out)

## PWR-REM5E-0505D
designator U?, comment REM5E-0505D/R10/A
5W DC/DC-Converter 'MEDLINE' DIP24 10kV reg 2:1; Manufacturer: Recom Power; SnapEDA_Link: https://www.snapeda.com/parts/REM5E-0505D/R10/A/Recom%20Power/view-part/?ref=snap; Package: DIP-24 Recom Power; PartNumber: REM5E-0505D/R10/A; ComponentLink1Description: Datasheet; ComponentLink1URL: https://recom-power.com/pdf/Medline_DC-DC/REM5E.pdf
footprint PWR-REM5E-0505D (Recom Power)
pins: 2 -VIN (power), 11 -VOUT (power), 14 +VOUT (power), 16 COM (power), 22 +VIN (power), 23 +VIN (power)

## PWR-RKZE-D
designator U?, comment RKZE-2405D/HP
2W DC/DC-Converter 'ECONOLINE' SIP7 4kV unreg; Manufacturer: Recom Power; Package: None; PartNumber: RKZE-2405D/HP; Price: None; Availability: Unavailable; SnapEDA_Link: https://www.snapeda.com/parts/RKZE-2405D/HP/Recom%20Power/view-part/?ref=snap; Value: *; ComponentLink1Description: Datasheet; ComponentLink1URL: https://recom-power.com/pdf/Econoline/RKZE.pdf; ComponentLink2Description: Manufacturer; ComponentLink2URL: https://recom-power.com/de/products/dc-dc-converters/rec-p-RKZE-2405D!sHP.html?11
footprint RECOM_SIP7 (Footprint not found)
pins: 1 +VIN (power), 2 -VIN (power), 5 -VOUT (power), 6 COM (power), 7 +VOUT (power)

## PWR-RP90Q-2412SRW/P
designator U?, comment RP90Q-2412SRW/P
90W DC/DC-Converter 'POWERLINE' 1/4 Brick 2.25kV r; Manufacturer: Recom Power; PinNumber: 8; Package: Quarter Brick Recom Power; Price: None; Availability: Unavailable; PartNumber: RP90Q-2412SRW/P; SnapEDA_Link: https://www.snapeda.com/parts/RP90Q-2412SRW/P/Recom%20Power/view-part/3644678/?ref=snap; ComponentLink1Description: Datasheet; ComponentLink1URL: https://recom-power.com/pdf/Powerline_DC-DC/RP90Q-RW.pdf; ComponentLink2Description: Manufacturer; ComponentLink2URL: https://recom-power.com/de/products/dc-dc-converters/rec-s-RP90Q-RW.html; Value: *; Typ: *; Voltage (V): *; Tolerance: *; Capacitance: *; Resistance: *; Power (W): *; Current (A): *
footprint RECOM_RP90Q-2412SRW
pins: 1 +VIN (in), 2 CTRL (in), 3 -VIN (in), 4 -VOUT (out), 5 -SENSE (in), 6 TRIM, 7 +SENSE (in), 8 +VOUT (out)


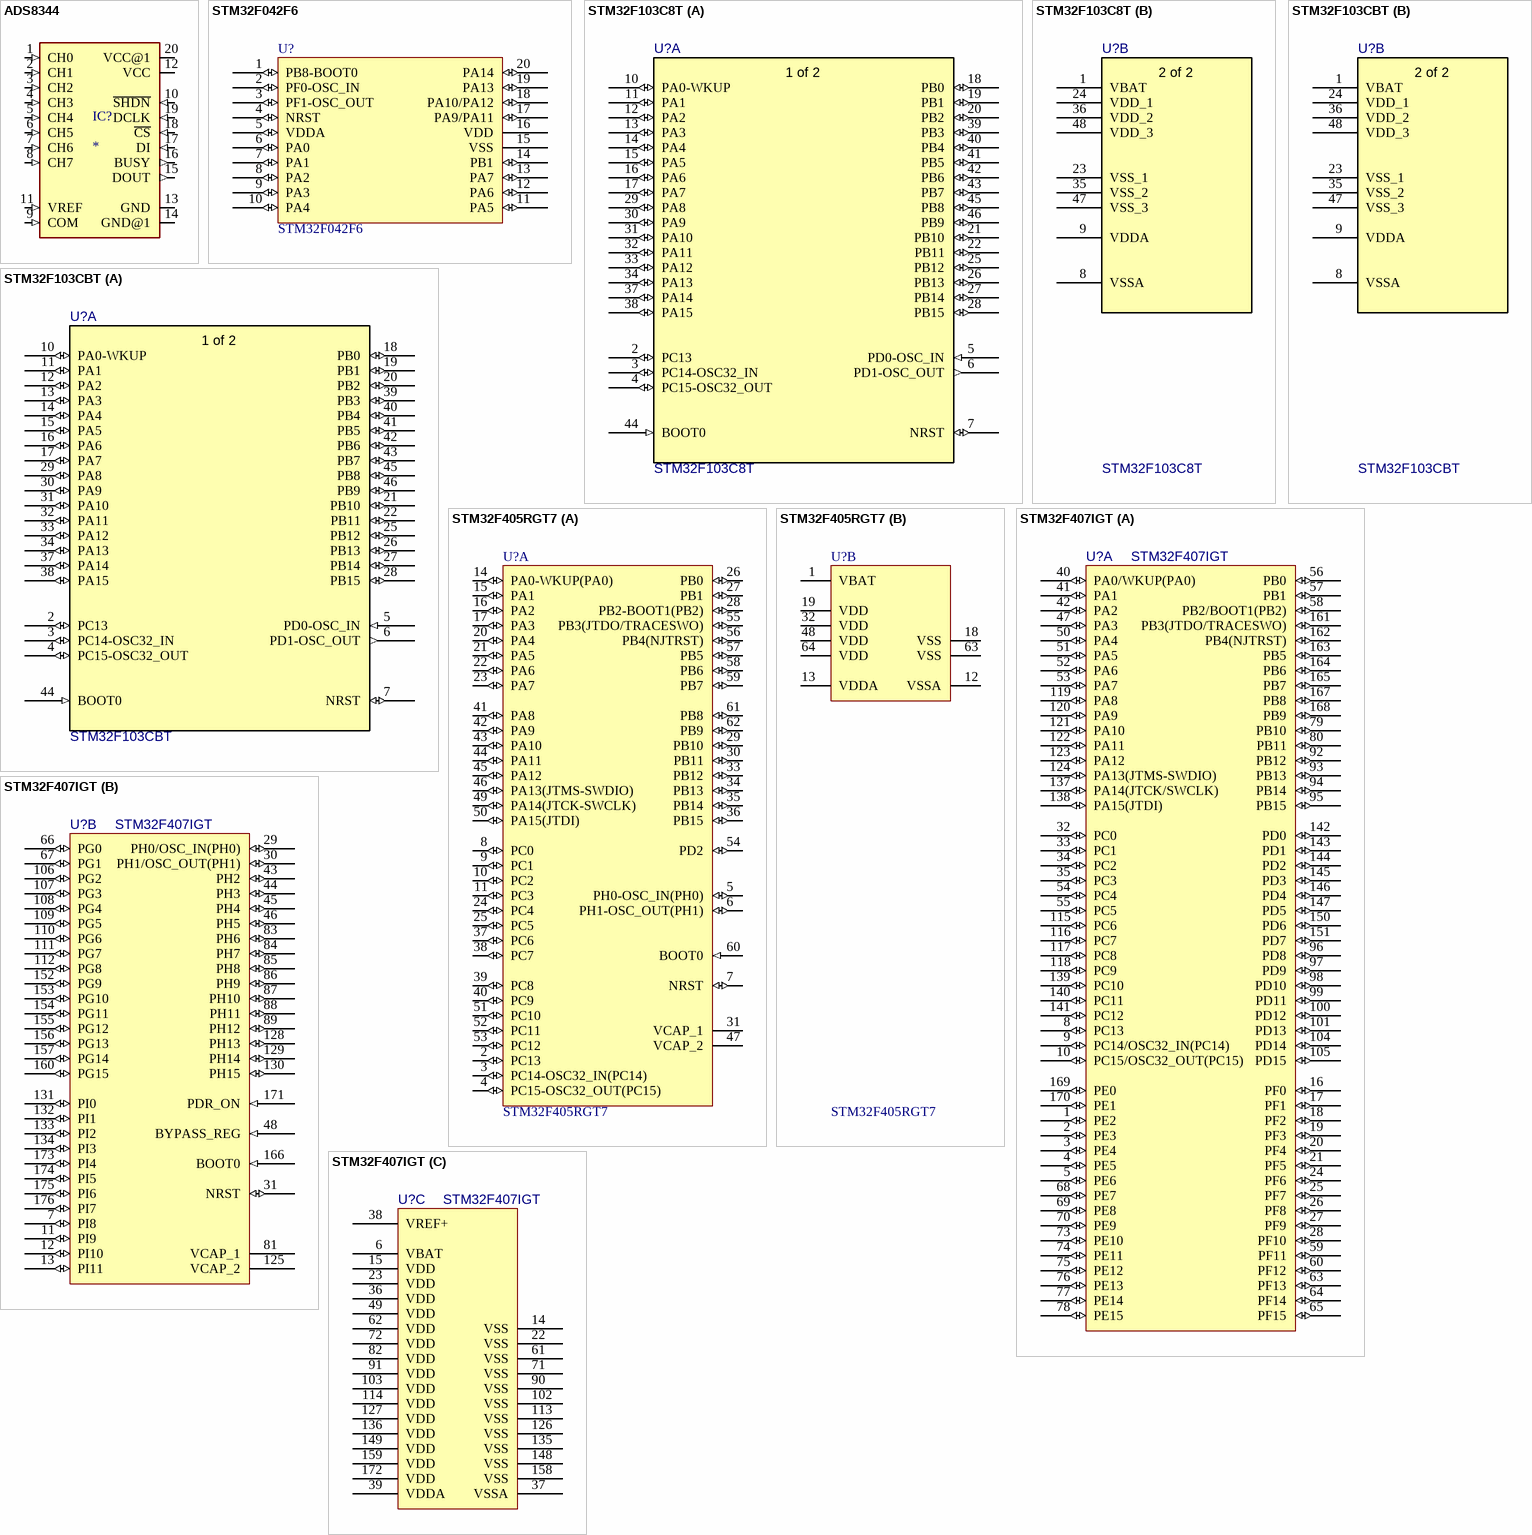
[diagram p22: symbols ADS8344 to STM32F407IGT]

## ADS8344
designator IC?
16 Bit Analog to Digital Converter 4, 8 Input 1 SAR 20-SSOP; MF: Texas Instruments; MP: ADS8344; SnapEDA_Link: https://www.snapeda.com/parts/ADS8344/Texas+Instruments/view-part/?ref=snap; Package: SSOP-20 Texas Instruments; Value: *; Check_prices: https://www.snapeda.com/parts/ADS8344/Texas+Instruments/view-part/?ref=eda
footprint SSOP20BU
pins: 1 CH0 (in), 2 CH1 (in), 3 CH2 (in), 4 CH3 (in), 5 CH4 (in), 6 CH5 (in), 7 CH6 (in), 8 CH7 (in), 9 COM (in), 10 ~{SHDN} (in), 11 VREF (in), 12 VCC (power), 13 GND (power), 14 GND@1 (power), 15 DOUT (out), 16 BUSY (out), 17 DI (in), 18 ~{CS} (in), 19 DCLK (in), 20 VCC@1 (power)

## STM32F042F6
designator U?
STM32 Microcontroller TSSOP20 Package, 32kbytes Flash; Manufactuer: STMicroelectronics; PartNumber: STM32F042F6; PinCount: 20; Package: TSSOP20; ComponentLink1Description: Datasheet; ComponentLink1URL: https://www.st.com/resource/en/datasheet/stm32f042f6.pdf
footprint SOP65P640X120-20N
pins: 1 PB8-BOOT0 (io), 2 PF0-OSC_IN (io), 3 PF1-OSC_OUT (io), 4 NRST (io), 5 VDDA (io), 6 PA0 (io), 7 PA1 (io), 8 PA2 (io), 9 PA3 (io), 10 PA4 (io), 11 PA5 (io), 12 PA6 (io), 13 PA7 (io), 14 PB1 (io), 15 VSS (power), 16 VDD (power), 17 PA9/PA11 (io), 18 PA10/PA12 (io), 19 PA13 (io), 20 PA14 (io)

## STM32F103C8T
designator U?
ARM Cortex-M3 MCU with 64 Kbytes of Flash memory, 72 MHz CPU, Mainstream Performance line, motor control, USB and CAN; Manufacturer: STMicroelectronics; PartNumber: STM32F103C8T6; Copyright: Copyright (C) 2022 Ultra Librarian. All rights reserved.; RefDes: RefDes; Type: DEV; ComponentLink1Description: Manufacturer; ComponentLink1URL: https://www.st.com/en/microcontrollers-microprocessors/stm32f103c8.html; ComponentLink2Description: Datasheet; ComponentLink2URL: https://www.st.com/resource/en/datasheet/stm32f103c8.pdf; ComponentLink3Description: Reference Manual; ComponentLink3URL: https://www.st.com/resource/en/reference_manual/rm0008-stm32f101xx-stm32f102xx-stm32f103xx-stm32f105xx-and-stm32f107xx-advanced-armbased-32bit-mcus-stmicroelectronics.pdf
footprint LQFP48 (STM)
footprint LQFP48_L (PT48A) (QFP, 48-Leads, Body 7x7mm, Pitch 0.5mm, IPC High Density)
footprint LQFP48_N (PT48A) (QFP, 48-Leads, Body 7x7mm, Pitch 0.5mm, IPC Medium Density)
footprint LQFP48_M (PT48A) (QFP, 48-Leads, Body 7x7mm, Pitch 0.5mm, IPC Low Density)
part A pins: 2 PC13 (io), 3 PC14-OSC32_IN (io), 4 PC15-OSC32_OUT (io), 5 PD0-OSC_IN (in), 6 PD1-OSC_OUT (out), 7 NRST (io), 10 PA0-WKUP (io), 11 PA1 (io), 12 PA2 (io), 13 PA3 (io), 14 PA4 (io), 15 PA5 (io), 16 PA6 (io), 17 PA7 (io), 18 PB0 (io), 19 PB1 (io), 20 PB2 (io), 21 PB10 (io), 22 PB11 (io), 25 PB12 (io), 26 PB13 (io), 27 PB14 (io), 28 PB15 (io), 29 PA8 (io), 30 PA9 (io), 31 PA10 (io), 32 PA11 (io), 33 PA12 (io), 34 PA13 (io), 37 PA14 (io), 38 PA15 (io), 39 PB3 (io), 40 PB4 (io), 41 PB5 (io), 42 PB6 (io), 43 PB7 (io), 44 BOOT0 (in), 45 PB8 (io), 46 PB9 (io)
part B pins: 1 VBAT (power), 8 VSSA (power), 9 VDDA (power), 23 VSS_1 (power), 24 VDD_1 (power), 35 VSS_2 (power), 36 VDD_2 (power), 47 VSS_3 (power), 48 VDD_3 (power)
part A text: 1 of 2
part B text: 2 of 2

## STM32F103CBT
designator U?